# Altium footprint library UP-ROBOT Connectors(2013-02-26).PcbLib: 121 footprints (part 6 of 8)
Each footprint in its own frame and in the unit in brackets; x right, y up, seen from the top. Pads: shape width x height; smd on the part's side, far side on the other; paste and mask are expansions set on the pad; w line width, h text height; cw(c..) or ccw(c..) is an arc to the next point about the centre after c.
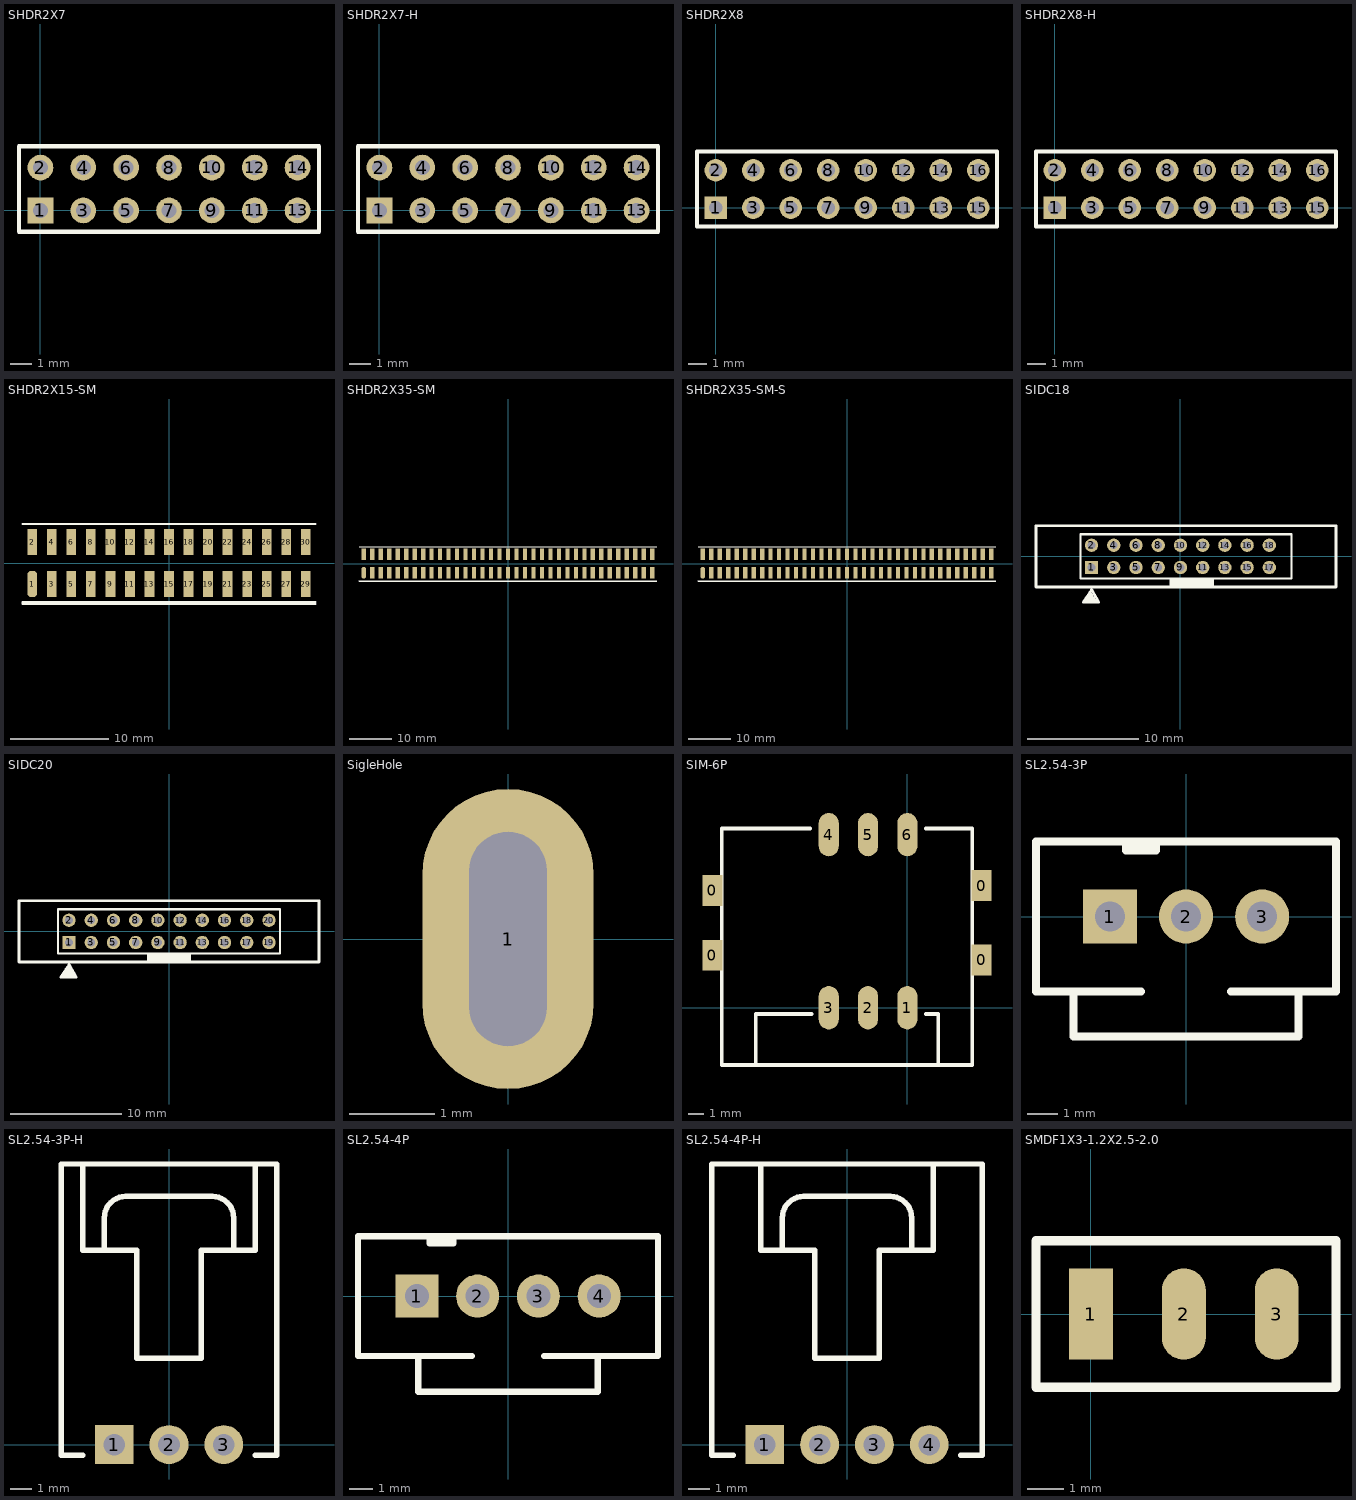
[diagram p5: the footprints below, top view; thin cyan lines are the x and y axes]

## SHDR2X7 [mm]
pads (14):
  rect 1.2x1.2 hole 0.7: 1(0,0)
  round 1.2 hole 0.7: 2(0,2) 3(2,0) 4(2,2) 5(4,0) 6(4,2) 7(6,0) 8(6,2) 9(8,0) 10(8,2) 11(10,0) 12(10,2) 13(12,0) 14(12,2)
Top Overlay:
  lines w0.203: -1,-1 13,-1 13,3 -1,3 -1,-1

## SHDR2X7-H [mm]
pads (14):
  rect 1.2x1.2 hole 0.7: 1(0,0)
  round 1.2 hole 0.7: 2(0,2) 3(2,0) 4(2,2) 5(4,0) 6(4,2) 7(6,0) 8(6,2) 9(8,0) 10(8,2) 11(10,0) 12(10,2) 13(12,0) 14(12,2)
Top Overlay:
  lines w0.203: -1,-1 -1,3 13,3 13,-1 -1,-1
3D body: height 4, standoff -3, extent -1.05,-7.375 12.95,2.325

## SHDR2X8 [mm]
pads (16):
  rect 1.2x1.2 hole 0.7: 1(0,0)
  round 1.2 hole 0.7: 2(0,2) 3(2,0) 4(2,2) 5(4,0) 6(4,2) 7(6,0) 8(6,2) 9(8,0) 10(8,2) 11(10,0) 12(10,2) 13(12,0) 14(12,2) 15(14,0) 16(14,2)
Top Overlay:
  lines w0.203: -1,-1 15,-1 15,3 -1,3 -1,-1

## SHDR2X8-H [mm]
pads (16):
  rect 1.2x1.2 hole 0.7: 1(0,0)
  round 1.2 hole 0.7: 2(0,2) 3(2,0) 4(2,2) 5(4,0) 6(4,2) 7(6,0) 8(6,2) 9(8,0) 10(8,2) 11(10,0) 12(10,2) 13(12,0) 14(12,2) 15(14,0) 16(14,2)
Top Overlay:
  lines w0.203: -1,-1 15,-1 15,3 -1,3 -1,-1
3D body: height 4, standoff -3, extent -0.975,-7.375 15.025,2.325

## SHDR2X15-SM [mm]
pads (30):
  oct 1x2.7 smd: 1(-14,-2.15)
  rect 1x2.7 smd: 2(-14,2.15) 3(-12,-2.15) 4(-12,2.15) 5(-10,-2.15) 6(-10,2.15) 7(-8,-2.15) 8(-8,2.15) 9(-6,-2.15) 10(-6,2.15) 11(-4,-2.15) 12(-4,2.15) 13(-2,-2.15) 14(-2,2.15) 15(0,-2.15) 16(0,2.15) 17(2,-2.15) 18(2,2.15) 19(4,-2.15) 20(4,2.15) 21(6,-2.15) 22(6,2.15) 23(8,-2.15) 24(8,2.15) 25(10,-2.15) 26(10,2.15) 27(12,-2.15) 28(12,2.15) 29(14,-2.15) 30(14,2.15)
Top Overlay:
  lines w0.2: -15,4 15,4 ; 15,-4.2 -15,-4.2 -15,-4 15,-4

## SHDR2X35-SM [mm]
pads (70):
  oct 1x2.7 smd: 1(-34,-2.15)
  rect 1x2.7 smd: 2(-34,2.15) 3(-32,-2.15) 4(-32,2.15) 5(-30,-2.15) 6(-30,2.15) 7(-28,-2.15) 8(-28,2.15) 9(-26,-2.15) 10(-26,2.15) 11(-24,-2.15) 12(-24,2.15) 13(-22,-2.15) 14(-22,2.15) 15(-20,-2.15) 16(-20,2.15) 17(-18,-2.15) 18(-18,2.15) 19(-16,-2.15) 20(-16,2.15) 21(-14,-2.15) 22(-14,2.15) 23(-12,-2.15) 24(-12,2.15) 25(-10,-2.15) 26(-10,2.15) 27(-8,-2.15) 28(-8,2.15) 29(-6,-2.15) 30(-6,2.15) 31(-4,-2.15) 32(-4,2.15) 33(-2,-2.15) 34(-2,2.15) 35(0,-2.15) 36(0,2.15) 37(2,-2.15) 38(2,2.15) 39(4,-2.15) 40(4,2.15) 41(6,-2.15) 42(6,2.15) 43(8,-2.15) 44(8,2.15) 45(10,-2.15) 46(10,2.15) 47(12,-2.15) 48(12,2.15) 49(14,-2.15) 50(14,2.15) 51(16,-2.15) 52(16,2.15) 53(18,-2.15) 54(18,2.15) 55(20,-2.15) 56(20,2.15) 57(22,-2.15) 58(22,2.15) 59(24,-2.15) 60(24,2.15) 61(26,-2.15) 62(26,2.15) 63(28,-2.15) 64(28,2.15) 65(30,-2.15) 66(30,2.15) 67(32,-2.15) 68(32,2.15) 69(34,-2.15) 70(34,2.15)
Top Overlay:
  lines w0.2: -35,4 35,4 ; -35,-4.2 -35,-4 35,-4 35,-4.2 -35,-4.2
3D body: height 6, standoff -0.5, extent -35.05,-3.75 34.95,3.645

## SHDR2X35-SM-S [mm]
pads (70):
  oct 1x2.7 smd: 1(-34,-2.15)
  rect 1x2.7 smd: 2(-34,2.15) 3(-32,-2.15) 4(-32,2.15) 5(-30,-2.15) 6(-30,2.15) 7(-28,-2.15) 8(-28,2.15) 9(-26,-2.15) 10(-26,2.15) 11(-24,-2.15) 12(-24,2.15) 13(-22,-2.15) 14(-22,2.15) 15(-20,-2.15) 16(-20,2.15) 17(-18,-2.15) 18(-18,2.15) 19(-16,-2.15) 20(-16,2.15) 21(-14,-2.15) 22(-14,2.15) 23(-12,-2.15) 24(-12,2.15) 25(-10,-2.15) 26(-10,2.15) 27(-8,-2.15) 28(-8,2.15) 29(-6,-2.15) 30(-6,2.15) 31(-4,-2.15) 32(-4,2.15) 33(-2,-2.15) 34(-2,2.15) 35(0,-2.15) 36(0,2.15) 37(2,-2.15) 38(2,2.15) 39(4,-2.15) 40(4,2.15) 41(6,-2.15) 42(6,2.15) 43(8,-2.15) 44(8,2.15) 45(10,-2.15) 46(10,2.15) 47(12,-2.15) 48(12,2.15) 49(14,-2.15) 50(14,2.15) 51(16,-2.15) 52(16,2.15) 53(18,-2.15) 54(18,2.15) 55(20,-2.15) 56(20,2.15) 57(22,-2.15) 58(22,2.15) 59(24,-2.15) 60(24,2.15) 61(26,-2.15) 62(26,2.15) 63(28,-2.15) 64(28,2.15) 65(30,-2.15) 66(30,2.15) 67(32,-2.15) 68(32,2.15) 69(34,-2.15) 70(34,2.15)
Top Overlay:
  lines w0.2: -35,4 35,4 ; -35,-4.2 35,-4.2 35,-4 -35,-4 -35,-4.2
3D body: height 4.99, standoff -0.01, extent -35.408,-4.623 35.592,4.377

## SIDC18 [mm]
pads (18):
  rect 1.2x1.2 hole 0.7: 1(-8,-1)
  round 1.2 hole 0.7: 2(-8,1) 3(-6,-1) 4(-6,1) 5(-4,-1) 6(-4,1) 7(-2,-1) 8(-2,1) 9(0,-1) 10(0,1) 11(2,-1) 12(2,1) 13(4,-1) 14(4,1) 15(6,-1) 16(6,1) 17(8,-1) 18(8,1)
Top Overlay:
  rectangle: -1,-2.75 3,-2
  lines w0.203: -9,-2 -9,2 10,2 10,-2 -9,-2
  lines w0.254: -8.554,-3.83 -8.275,-4.125 ; -8.426,-3.639 -8.125,-4.125 ; -8.289,-3.433 -7.85,-4.125 ; -8.146,-3.219 -7.6,-4.125 ; -13,-2.75 14,-2.75 14,2.75 1,2.75 -13,2.75 -13,-2.75 ; -8.75,-4.125 -8,-3 -7.35,-4.125 -8.75,-4.125

## SIDC20 [mm]
pads (20):
  rect 1.2x1.2 hole 0.7: 1(-9,-1)
  round 1.2 hole 0.7: 2(-9,1) 3(-7,-1) 4(-7,1) 5(-5,-1) 6(-5,1) 7(-3,-1) 8(-3,1) 9(-1,-1) 10(-1,1) 11(1,-1) 12(1,1) 13(3,-1) 14(3,1) 15(5,-1) 16(5,1) 17(7,-1) 18(7,1) 19(9,-1) 20(9,1)
Top Overlay:
  rectangle: -2,-2.75 2,-2
  lines w0.203: -10,-2 -10,2 10,2 10,-2 -10,-2
  lines w0.254: -9.554,-3.83 -9.275,-4.125 ; -9.426,-3.639 -9.125,-4.125 ; -9.289,-3.433 -8.85,-4.125 ; -9.146,-3.219 -8.6,-4.125 ; -13.5,-2.75 13.5,-2.75 13.5,2.75 0,2.75 -13.5,2.75 -13.5,-2.75 ; -9.75,-4.125 -9,-3 -8.35,-4.125 -9.75,-4.125
3D body: height 5.5, standoff -3, extent -13.55,-2.825 13.45,2.675

## SigleHole [mm]
pads (1):
  oval 2x3.5 hole 0.9 slot 2.5 at 90 deg: 1(0,0)

## SIM-6P [mm]
pads (10):
  rect 1.3x2 smd: 0(-12.6,3.4) 0(-12.6,7.6) 0(4.8,3.1) 0(4.8,7.9)
  oval 1.3x2.8 smd: 1(0,0) 2(-2.54,0) 3(-5.08,0) 4(-5.08,11.2) 5(-2.54,11.2) 6(0,11.2)
Top Overlay:
  lines w0.254: -6.3,11.6 -12,11.6 -12,-3.7 -9.8,-3.7 ; -6.2,-0.4 -9.8,-0.4 -9.8,-3.7 ; 1.2,-0.4 2,-0.4 2,-3.7 ; 1.2,11.6 4.2,11.6 4.2,-3.7 2,-3.7 ; -9.8,-3.7 2,-3.7

## SL2.54-3P [mm]
pads (3):
  rect 1.8x1.8 hole 1: 1(-2.54,0)
  round 1.8 hole 1: 2(0,0) 3(2.54,0)
Top Overlay:
  lines w0.254: -3.3,2.5 -3.275,2.5 ; -2,2.35 -1,2.35 ; -2,2.5 -2,2.2 -1,2.2 -1,2.5 ; -1.5,-2.5 -3.75,-2.5 ; 1.5,-2.5 3.75,-2.5 ; -3.75,-2.5 -3.75,-4 3.75,-4 3.75,-2.5 ; -3.75,-2.5 -5,-2.5 -5,2.5 5,2.5 5,-2.5 3.75,-2.5
3D body: height 2.2, standoff -12.2, extent -4.95,-4 5.05,2.5

## SL2.54-3P-H [mm]
pads (3):
  rect 1.8x1.8 hole 1: 1(-2.54,0)
  round 1.8 hole 1: 2(0,0) 3(2.54,0)
Top Overlay:
  lines w0.254: -4,-0.5 -5,-0.5 -5,2.5 -5,13 5,13 5,2.5 5,-0.5 4,-0.5 ; -4,13 -4,9 -1.5,9 -1.5,4 1.5,4 1.5,9 4,9 4,13 ; -3,9 -3,10.5 cw(c-2,10.5) -2,11.5 2,11.5 cw(c2,10.5) 3,10.5 3,9
3D body: height 6.72, standoff -3.26, extent -5.04,-0.35 4.96,13.05

## SL2.54-4P [mm]
pads (4):
  rect 1.8x1.8 hole 1: 1(-3.81,0)
  round 1.8 hole 1: 2(-1.27,0) 3(1.27,0) 4(3.81,0)
Top Overlay:
  lines w0.254: -4.57,2.5 -4.545,2.5 ; -3.27,2.35 -2.27,2.35 ; -3.27,2.5 -3.27,2.2 -2.27,2.2 -2.27,2.5 ; -1.5,-2.5 -3.75,-2.5 ; 1.5,-2.5 3.75,-2.5 3.75,-4 -3.75,-4 -3.75,-2.5 ; 2.48,-2.5 6.27,-2.5 6.27,2.5 -6.27,2.5 -6.27,-2.5 -3.75,-2.5

## SL2.54-4P-H [mm]
pads (4):
  rect 1.8x1.8 hole 1: 1(-3.81,0)
  round 1.8 hole 1: 2(-1.27,0) 3(1.27,0) 4(3.81,0)
Top Overlay:
  lines w0.254: -5.27,-0.5 -6.27,-0.5 -6.27,2.5 -6.27,13 6.27,13 6.27,2.5 6.27,-0.5 5.27,-0.5 ; -4,13 -4,9 -1.5,9 -1.5,4 1.5,4 1.5,9 4,9 4,13 ; -3,9 -3,10.5 cw(c-2,10.5) -2,11.5 2,11.5 cw(c2,10.5) 3,10.5 3,9

## SMDF1X3-1.2X2.5-2.0 [mm]
pads (3):
  rect 1.2x2.5 smd: 1(0,0)
  oval 1.2x2.5 smd: 2(2.54,0) 3(5.08,0)
Top Overlay:
  lines w0.254: -1.5,-2 6.7,-2 6.7,2 -1.5,2 -1.5,0 -1.5,-2